# Altium footprint library Active.PcbLib: 325 footprints (part 21 of 23)
Each footprint in its own frame and in the unit in brackets; x right, y up, seen from the top. Pads: shape width x height; smd on the part's side, far side on the other; paste and mask are expansions set on the pad; w line width, h text height; cw(c..) or ccw(c..) is an arc to the next point about the centre after c.
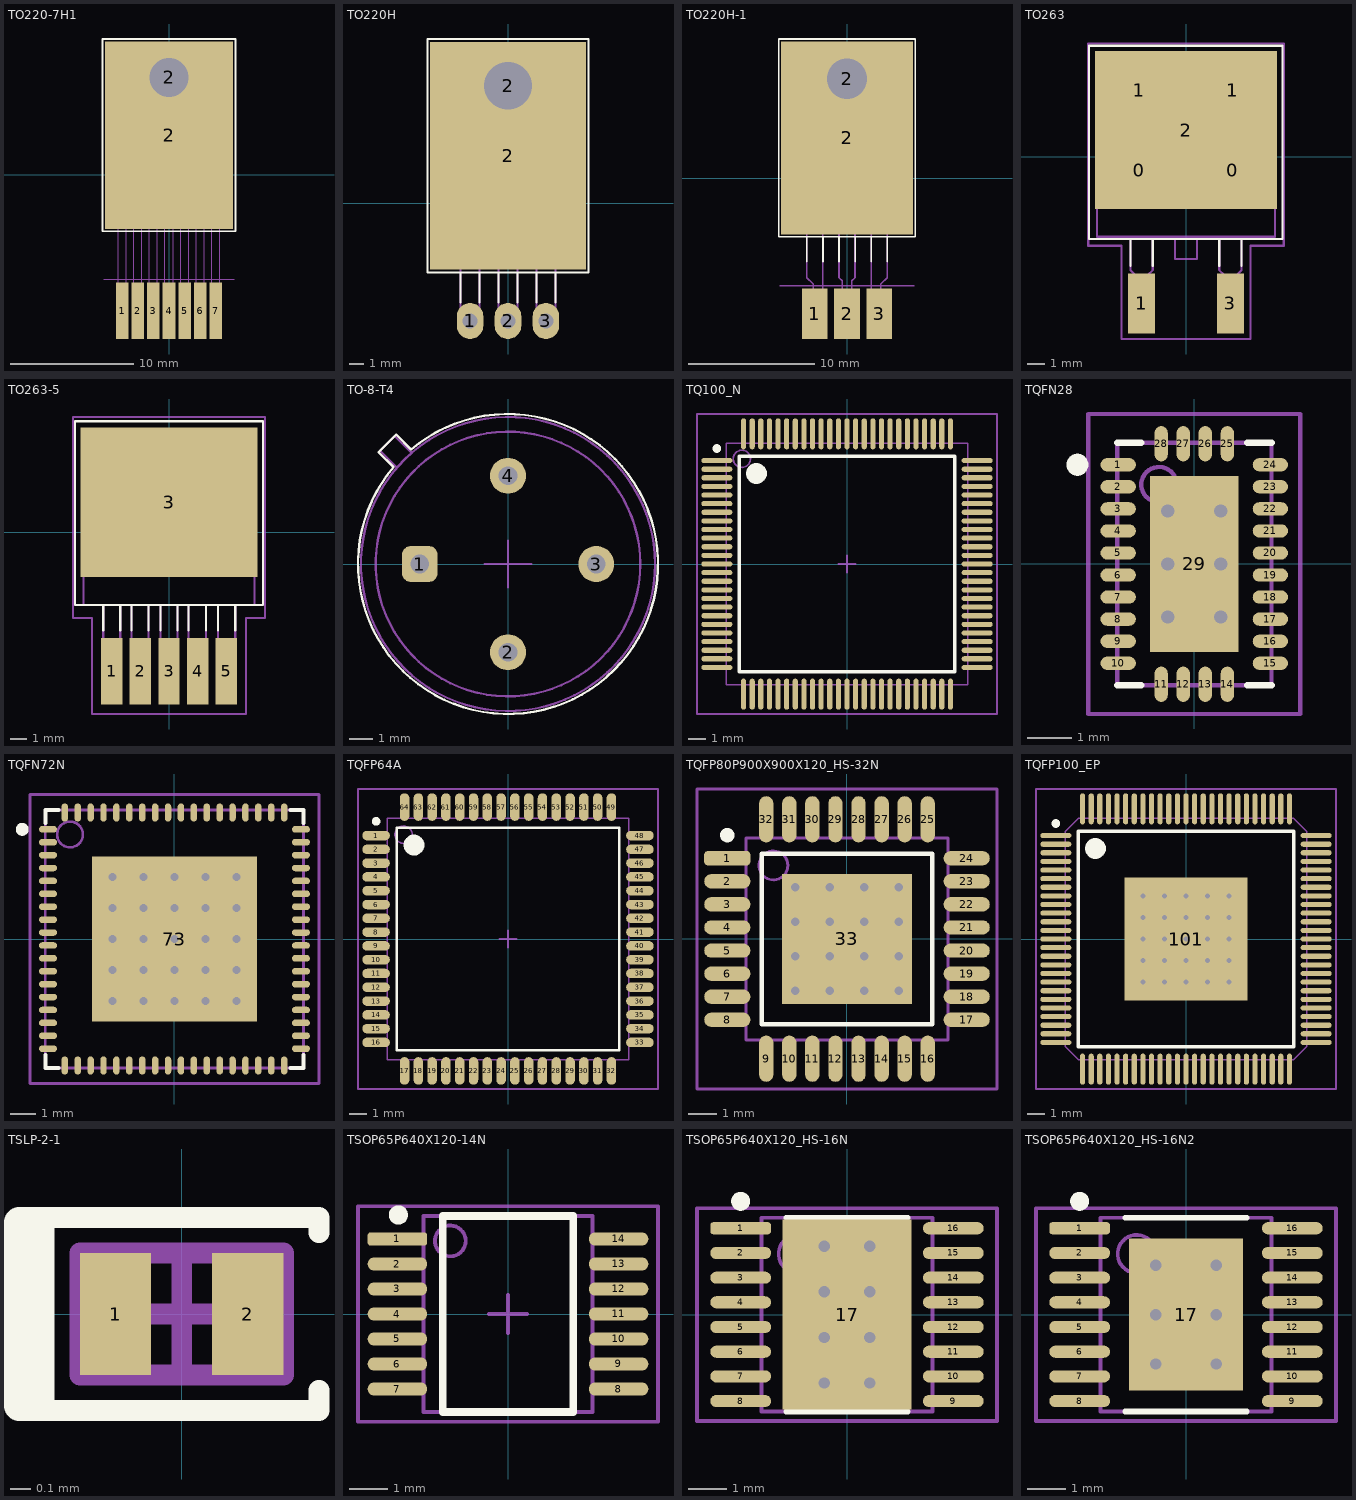
[diagram p20: the footprints below, top view; thin cyan lines are the x and y axes]

## TO220-7H1 [mil] "TO-220 horizontal 7pin"
height 196.85
pads (9):
  rect 40x180 smd mask+2.76: 1(-150,-435) 2(-100,-435) 3(-50,-435) 4(0,-435) 5(50,-435) 6(100,-435) 7(150,-435)
  rect 410x600 smd paste-500: 2(0,126.02)
  round 157.48 hole 125.98 mask+47.24: 2(0,311.02)
Top Overlay:
  lines w5: -212.6,-181.06 -212.6,434.09 212.6,434.09 212.6,-181.06 -212.6,-181.06
Mechanical 13:
  circle w3.94: c0,311.02 r75
  lines w3.94: -192.92,-169.29 -192.92,156.02 ; -163,-168.98 -163,-458 -158,-490 -142,-490 -137,-458 -137,-168.98 ; -113,-168.98 -113,-458 -108,-490 -92,-490 -87,-458 -87,-168.98 ; -63,-168.98 -63,-458 -58,-490 -42,-490 -37,-458 -37,-168.98 ; -13,-168.98 -13,-458 -8,-490 8,-490 13,-458 13,-168.98 ; 37,-168.98 37,-458 42,-490 58,-490 63,-458 63,-168.98 ; 87,-168.98 87,-458 92,-490 108,-490 113,-458 113,-168.98 ; 137,-168.98 137,-458 142,-490 158,-490 163,-458 163,-168.98 ; 192.91,-169.29 192.91,156.02 ; -200,171.02 200,171.02 ; -200,171.02 -200,-168.98 200,-168.98 200,171.02 ; -200,171.02 -200,421.02 200,421.02 200,171.02 ; -200,171.02 -192.92,156.02 ; -192.92,156.02 192.91,156.02 ; 192.91,156.02 200,171.02
Mechanical 15:
  lines w3.94: -208.66,-334.65 208.66,-334.65
3D body: height 114.17, standoff 102.36, extent 137,-490 163,-168.98
3D body: height 114.17, standoff 102.36, extent -163,-490 -137,-168.98
3D body: height 114.17, standoff 102.36, extent -113,-490 -87,-168.98
3D body: height 114.17, standoff 102.36, extent -63,-490 -37,-168.98
3D body: height 114.17, standoff 102.36, extent 87,-490 113,-168.98
3D body: height 114.17, standoff 102.36, extent 37,-490 63,-168.98
3D body: height 114.17, standoff 102.36, extent -13,-490 13,-168.98
3D body: height 39.37, standoff 0, extent -200,171.02 200,421.02
3D body: height 196.85, standoff 0, extent -200,-168.98 200,171.02

## TO220H [mil] "TO-220 horizontal"
height 196.85
pads (5):
  oval 70x95 hole 39.37: 1(-100,-310) 2(0,-310) 3(100,-310)
  rect 410x600 smd paste-500: 2(0,125)
  round 157.48 hole 125.98 mask+47.24: 2(0,310)
Top Overlay:
  lines w5: -125,-260.83 -125,-182.09 ; -74.8,-260.83 -74.8,-182.09 ; -25,-260.83 -25,-182.09 ; 25.2,-260.83 25.2,-182.09 ; 75,-260.83 75,-182.09 ; 125.2,-260.83 125.2,-182.09 ; -212.6,-182.09 -212.6,433.07 212.6,433.07 212.6,-182.09 -212.6,-182.09
Mechanical 13:
  circle w5: c0,310 r75
  lines w5: -200,155 200,155 ; -125,-170 -125,-310 -75,-310 -75,-170 ; -25,-170 -25,-310 25,-310 25,-170 ; 75,-170 75,-310 125,-310 125,-170 ; -200,170 200,170 ; -200,170 -200,-170 200,-170 200,170 ; -200,170 -200,420 200,420 200,170
3D body: height 102.36, standoff 90.55, extent 75,-320 125,-170
3D body: height 90.55, standoff 0, extent 75,-320 125,-305
3D body: height 102.36, standoff 90.55, extent -25,-320 25,-170
3D body: height 90.55, standoff 0, extent -25,-320 25,-305
3D body: height 90.55, standoff 0, extent -125,-320 -75,-305
3D body: height 102.36, standoff 90.55, extent -125,-320 -75,-170
3D body: height 39.37, standoff 0, extent -200,170 200,420
3D body: height 196.85, standoff 0, extent -200,-170 200,170
3D body: height 0, standoff -125.98, extent -116.14,-317.91 -83.66,-302.17
3D body: height 0, standoff -125.98, extent -16.14,-317.91 16.34,-302.17
3D body: height 0, standoff -125.98, extent 83.86,-317.91 116.34,-302.17

## TO220H-1 [mm] "TO-220 horizontal"
height 5
pads (5):
  rect 2.032x4 smd: 1(-2.54,-10.7) 2(0,-10.7) 3(2.54,-10.7)
  rect 10.414x15.24 smd paste-12.7: 2(0,3.201)
  round 4 hole 3.2 mask+1.2: 2(0,7.9)
Top Overlay:
  lines w0.127: -3.175,-6.599 -3.175,-4.599 ; -1.9,-6.599 -1.9,-4.599 ; -0.635,-6.599 -0.635,-4.599 ; 0.64,-6.599 0.64,-4.599 ; 1.905,-6.599 1.905,-4.599 ; 3.18,-6.599 3.18,-4.599 ; -5.4,-4.599 -5.4,11.026 5.4,11.026 5.4,-4.599 -5.4,-4.599
Mechanical 13:
  circle w0.127: c0,7.9 r1.905
  lines w0.127: -5.08,3.963 5.08,3.963 ; -3.175,-4.292 -3.175,-7.848 -2.667,-8.356 -2.667,-12.345 -1.905,-12.345 -1.905,-7.848 -1.905,-4.292 ; -0.635,-4.292 -0.635,-7.848 -0.381,-8.102 -0.381,-8.356 -0.381,-12.345 0.381,-12.345 0.381,-8.102 0.635,-7.848 0.635,-4.292 ; 1.905,-4.292 1.905,-7.848 1.905,-12.345 2.667,-12.345 2.667,-8.356 3.175,-7.848 3.175,-4.292 ; -5.08,4.344 5.08,4.344 ; -5.08,4.344 -5.08,-4.292 5.08,-4.292 5.08,4.344 ; -5.08,4.344 -5.08,10.694 5.08,10.694 5.08,4.344
Mechanical 15:
  lines w0.1: -5.3,-8.5 5.3,-8.5
3D body: height 2.6, standoff 2.3, extent 1.905,-12.345 3.175,-4.292
3D body: height 2.6, standoff 2.3, extent -0.635,-12.345 0.635,-4.292
3D body: height 2.6, standoff 2.3, extent -3.175,-12.345 -1.905,-4.292
3D body: height 1, standoff 0, extent -5.08,4.344 5.08,10.694
3D body: height 5, standoff 0, extent -5.08,-4.292 5.08,4.344

## TO263 [mil] "TO263 3pin D2PAK"
height 137.8
pads (7):
  rrect8% 190x160 on Top Paste mask+275.59: 0(-105,-30) 0(105,-30) 1(-105,150) 1(105,150)
  rect 60x135 smd: 1(-100,-330) 3(100,-330)
  rect 410x355 smd paste-196.85: 2(0,60)
Top Overlay:
  lines w5: -125,-245 -125,-185 ; -75,-245 -75,-185 ; 75,-245 75,-185 ; 125,-245 125,-185 ; -218,-185 -218,250 217,250 217,-185 -218,-185
Mechanical 13:
  lines w5: -125,-180 -125,-255 -115,-265 -115,-370 -85,-370 -85,-265 -75,-255 -75,-180 ; -25,-180 -25,-230 25,-230 25,-180 ; 75,-180 75,-255 85,-265 85,-370 115,-370 115,-265 125,-255 125,-180 ; -200,-180 -200,215 -120,230 120,230 200,215 200,-180 -200,-180
  lines w6: -200,180 200,180
Mechanical 15:
  lines w5: -220,-200 -145,-200 -145,-410 145,-410 145,-200 220,-200 220,255 -220,255 -220,-200
3D body: height 105, standoff 80, extent -25,-230 25,-180
3D body: height 105, standoff 80, extent 75,-265 125,-180
3D body: height 105, standoff 0, extent 85,-280 115,-265
3D body: height 20, standoff 0, extent 85,-370 115,-280
3D body: height 20, standoff 0, extent -115,-370 -85,-280
3D body: height 105, standoff 0, extent -115,-280 -85,-265
3D body: height 105, standoff 80, extent -125,-265 -75,-180
3D body: height 175, standoff 0, extent -200,-180 200,180
3D body: height 50, standoff 0, extent -200,180 200,230

## TO263-5 [mil]
height 137.8
pads (6):
  rect 50x155 smd: 1(-134,-325) 2(-67,-325) 3(0,-325) 4(67,-325) 5(134,-325)
  rect 414.02x350 smd paste-393.7: 3(0,70)
Top Overlay:
  lines w5: -154,-230 -154,-170 ; -114,-230 -114,-170 ; -88,-230 -88,-170 ; -48,-230 -48,-170 ; -20,-230 -20,-170 ; 20,-230 20,-170 ; 46,-230 46,-170 ; 87,-230 87,-170 ; 115,-230 115,-170 ; 155,-230 155,-170 ; -220,-170 220,-170 220,260 -220,260 -220,-170
Top Paste:
  circle w35.43: c165.35,-59.06 r17.72
  circle w35.43: c82.68,-59.06 r17.72
  circle w35.43: c-165.35,-59.06 r17.72
  circle w35.43: c-82.68,-59.06 r17.72
  circle w35.43: c0,-59.06 r17.72
  circle w35.43: c0,27.56 r17.72
  circle w35.43: c-82.68,27.56 r17.72
  circle w35.43: c-165.35,27.56 r17.72
  circle w35.43: c82.68,27.56 r17.72
  circle w35.43: c165.35,27.56 r17.72
  circle w35.43: c0,114.17 r17.72
  circle w35.43: c-82.68,114.17 r17.72
  circle w35.43: c-165.35,114.17 r17.72
  circle w35.43: c82.68,114.17 r17.72
  circle w35.43: c165.35,114.17 r17.72
  circle w35.43: c0,200.79 r17.72
  circle w35.43: c-82.68,200.79 r17.72
  circle w35.43: c-165.35,200.79 r17.72
  circle w35.43: c82.68,200.79 r17.72
  circle w35.43: c165.35,200.79 r17.72
Mechanical 13:
  lines w5: -154,-170 -154,-340 -114,-340 -114,-170 ; -88,-170 -88,-340 -48,-340 -48,-170 200,-170 ; -20,-170 -20,-340 20,-340 20,-170 ; 46,-170 46,-340 86,-340 ; 87,-340 87,-170 ; 115,-170 115,-340 155,-340 155,-170 ; -200,170 200,170 ; -200,170 -200,-170 200,-170 ; -200,170 -200,220 200,220 200,170 ; 200,-170 200,170
Mechanical 15:
  lines w4: -40,0 40,0 ; 0,-40 0,40
  lines w5: -225,-200 -180,-200 -180,-425 180,-425 180,-200 225,-200 225,270 -225,270 -225,-200
3D body: height 137.8, standoff 0, extent -200,-170 200,170
3D body: height 39.37, standoff 0, extent -200,170 200,220
3D body: height 19.68, standoff 0, extent -154,-340 -114,-170
3D body: height 19.68, standoff 0, extent -87.83,-340 -47.83,-170
3D body: height 19.68, standoff 0, extent -19.83,-340 20.17,-170
3D body: height 19.68, standoff 0, extent 47.17,-340 87.17,-170
3D body: height 19.68, standoff 0, extent 115.17,-340 155.17,-170

## TO-8-T4 [mm] "TO-8 4pin metal"
height 7
pads (4):
  rrect50% 1.55x1.55 hole 0.8: 1(-3.81,0)
  round 1.55 hole 0.8: 2(0,-3.81) 3(3.81,0) 4(0,3.81)
Top Overlay:
  lines w0.1: -4.944,4.184 ccw(c0,0) -4.184,4.944
  lines w0.102: -4.944,4.184 -5.587,4.826 -5.588,4.826 -4.826,5.588 -4.184,4.946 -4.184,4.944
Mechanical 13:
  circle w0.1: c0,0 r6.35
  circle w0.1: c0,0 r5.715
  lines w0.102: -4.826,4.191 -5.524,4.889 -4.889,5.524 -4.191,4.826
Mechanical 15:
  lines w0.102: -1.016,0 1.016,0 ; 0,-1.016 0,1.016
3D body: height 7, standoff 0, extent -5.715,-5.715 5.715,5.715
3D body: height 1, standoff 0, extent -6.35,-6.35 6.35,6.35
3D body: height 1, standoff 0, extent -5.524,4.191 -4.191,5.524

## TQ100_N [mm] "Thin QFP 100, 14x14mm, R0.5mm, IPC Medium Density"
height 1.6
pads (100):
  oval 1.8x0.3 smd mask+0.051: 1(-7.55,6) 2(-7.55,5.5) 3(-7.55,5) 4(-7.55,4.5) 5(-7.55,4) 6(-7.55,3.5) 7(-7.55,3) 8(-7.55,2.5) 9(-7.55,2) 10(-7.55,1.5) 11(-7.55,1) 12(-7.55,0.5) 13(-7.55,0) 14(-7.55,-0.5) 15(-7.55,-1) 16(-7.55,-1.5) 17(-7.55,-2) 18(-7.55,-2.5) 19(-7.55,-3) 20(-7.55,-3.5) 21(-7.55,-4) 22(-7.55,-4.5) 23(-7.55,-5) 24(-7.55,-5.5) 25(-7.55,-6) 51(7.55,-6) 52(7.55,-5.5) 53(7.55,-5) 54(7.55,-4.5) 55(7.55,-4) 56(7.55,-3.5) 57(7.55,-3) 58(7.55,-2.5) 59(7.55,-2) 60(7.55,-1.5) 61(7.55,-1) 62(7.55,-0.5) 63(7.55,0) 64(7.55,0.5) 65(7.55,1) 66(7.55,1.5) 67(7.55,2) 68(7.55,2.5) 69(7.55,3) 70(7.55,3.5) 71(7.55,4) 72(7.55,4.5) 73(7.55,5) 74(7.55,5.5) 75(7.55,6)
  oval 0.3x1.8 smd mask+0.051: 26(-6,-7.55) 27(-5.5,-7.55) 28(-5,-7.55) 29(-4.5,-7.55) 30(-4,-7.55) 31(-3.5,-7.55) 32(-3,-7.55) 33(-2.5,-7.55) 34(-2,-7.55) 35(-1.5,-7.55) 36(-1,-7.55) 37(-0.5,-7.55) 38(0,-7.55) 39(0.5,-7.55) 40(1,-7.55) 41(1.5,-7.55) 42(2,-7.55) 43(2.5,-7.55) 44(3,-7.55) 45(3.5,-7.55) 46(4,-7.55) 47(4.5,-7.55) 48(5,-7.55) 49(5.5,-7.55) 50(6,-7.55) 76(6,7.55) 77(5.5,7.55) 78(5,7.55) 79(4.5,7.55) 80(4,7.55) 81(3.5,7.55) 82(3,7.55) 83(2.5,7.55) 84(2,7.55) 85(1.5,7.55) 86(1,7.55) 87(0.5,7.55) 88(0,7.55) 89(-0.5,7.55) 90(-1,7.55) 91(-1.5,7.55) 92(-2,7.55) 93(-2.5,7.55) 94(-3,7.55) 95(-3.5,7.55) 96(-4,7.55) 97(-4.5,7.55) 98(-5,7.55) 99(-5.5,7.55) 100(-6,7.55)
Top Overlay:
  circle w0.6: c-5.25,5.25 r0.3
  circle w0.25: c-7.55,6.7 r0.125
  lines w0.2: -6.25,-6.25 6.25,-6.25 6.25,6.25 -6.25,6.25 -6.25,-6.25
Mechanical 13:
  circle w0.1: c-6.1,6.1 r0.5
  lines w0.1: -7,-7 7,-7 7,7 -7,7 -7,-7
Mechanical 15:
  lines w0.1: -0.5,0 0.5,0 ; 0,-0.5 0,0.5 ; -8.7,-8.7 8.7,-8.7 8.7,8.7 -8.7,8.7 -8.7,-8.7
3D body: height 1.6, standoff 0, extent -7,-7 7,7

## TQFN28 [mm] "TQFN 28pin 0.8mm R0.5mm"
height 0.8
pads (29):
  oval 0.8x0.3 smd mask+0.025: 1(-1.725,2.25) 2(-1.725,1.75) 3(-1.725,1.25) 4(-1.725,0.75) 5(-1.725,0.25) 6(-1.725,-0.25) 7(-1.725,-0.75) 8(-1.725,-1.25) 9(-1.725,-1.75) 10(-1.725,-2.25) 15(1.725,-2.25) 16(1.725,-1.75) 17(1.725,-1.25) 18(1.725,-0.75) 19(1.725,-0.25) 20(1.725,0.25) 21(1.725,0.75) 22(1.725,1.25) 23(1.725,1.75) 24(1.725,2.25)
  oval 0.3x0.8 smd mask+0.025: 11(-0.75,-2.725) 12(-0.25,-2.725) 13(0.25,-2.725) 14(0.75,-2.725) 25(0.75,2.725) 26(0.25,2.725) 27(-0.25,2.725) 28(-0.75,2.725)
  rect 2x4 smd paste-5 mask-3: 29(0,0)
via 0.6,-1.2 diameter 0.65 hole 0.3
via -0.6,-1.2 diameter 0.65 hole 0.3
via 0.6,0 diameter 0.65 hole 0.3
via -0.6,0 diameter 0.65 hole 0.3
via 0.6,1.2 diameter 0.65 hole 0.3
via -0.6,1.2 diameter 0.65 hole 0.3
Top Overlay:
  circle w0.25: c-2.65,2.25 r0.125
  lines w0.15: -1.75,-2.75 -1.2,-2.75 ; -1.75,2.75 -1.2,2.75 ; 1.2,-2.75 1.75,-2.75 ; 1.2,2.75 1.75,2.75
Top Paste:
  region: -0.9,-0.85 -0.475,-0.85 -0.25,-1.075 0.25,-1.075 0.475,-0.85 0.9,-0.85 0.9,-0.35 0.475,-0.35 0.275,-0.15 -0.275,-0.15 -0.475,-0.35 -0.9,-0.35
  region: -0.9,-1.9 -0.9,-1.55 -0.475,-1.55 -0.25,-1.325 0.25,-1.325 0.475,-1.55 0.9,-1.55 0.9,-1.9
  region: -0.9,1.9 -0.9,1.55 -0.475,1.55 -0.25,1.325 0.25,1.325 0.475,1.55 0.9,1.55 0.9,1.9
  region: -0.9,0.85 -0.475,0.85 -0.25,1.075 0.25,1.075 0.475,0.85 0.9,0.85 0.9,0.35 0.475,0.35 0.275,0.15 -0.275,0.15 -0.475,0.35 -0.9,0.35
Top Solder:
  drawing of 1 lines, arcs and shapes, not listed
Mechanical 12:
  circle w0.4: c-0.6,1.2 r0.15
  circle w0.4: c0.6,1.2 r0.15
  circle w0.4: c-0.6,0 r0.15
  circle w0.4: c0.6,0 r0.15
  circle w0.4: c-0.6,-1.2 r0.15
  circle w0.4: c0.6,-1.2 r0.15
Mechanical 13:
  circle w0.1: c-0.8,1.8 r0.4
  lines w0.1: -1.75,-2.75 1.75,-2.75 1.75,2.75 -1.75,2.75 -1.75,-2.75
Mechanical 15:
  lines w0.1: -0.5,0 0.5,0 ; 0,-0.5 0,0.5 ; -2.4,-3.4 2.4,-3.4 2.4,3.4 -2.4,3.4 -2.4,-3.4
3D body: height 0.8, standoff 0.01, extent -1.75,-2.75 1.75,2.75
3D body: height 0.81, standoff 0.8, extent -1.2,1.4 -0.4,2.2

## TQFN72N [mm]
height 0.8
pads (73):
  oval 0.7x0.25 smd mask+0.025: 1(-4.9,4.25) 2(-4.9,3.75) 3(-4.9,3.25) 4(-4.9,2.75) 5(-4.9,2.25) 6(-4.9,1.75) 7(-4.9,1.25) 8(-4.9,0.75) 9(-4.9,0.25) 10(-4.9,-0.25) 11(-4.9,-0.75) 12(-4.9,-1.25) 13(-4.9,-1.75) 14(-4.9,-2.25) 15(-4.9,-2.75) 16(-4.9,-3.25) 17(-4.9,-3.75) 18(-4.9,-4.25) 37(4.9,-4.25) 38(4.9,-3.75) 39(4.9,-3.25) 40(4.9,-2.75) 41(4.9,-2.25) 42(4.9,-1.75) 43(4.9,-1.25) 44(4.9,-0.75) 45(4.9,-0.25) 46(4.9,0.25) 47(4.9,0.75) 48(4.9,1.25) 49(4.9,1.75) 50(4.9,2.25) 51(4.9,2.75) 52(4.9,3.25) 53(4.9,3.75) 54(4.9,4.25)
  oval 0.25x0.7 smd mask+0.025: 19(-4.25,-4.9) 20(-3.75,-4.9) 21(-3.25,-4.9) 22(-2.75,-4.9) 23(-2.25,-4.9) 24(-1.75,-4.9) 25(-1.25,-4.9) 26(-0.75,-4.9) 27(-0.25,-4.9) 28(0.25,-4.9) 29(0.75,-4.9) 30(1.25,-4.9) 31(1.75,-4.9) 32(2.25,-4.9) 33(2.75,-4.9) 34(3.25,-4.9) 35(3.75,-4.9) 36(4.25,-4.9) 55(4.25,4.9) 56(3.75,4.9) 57(3.25,4.9) 58(2.75,4.9) 59(2.25,4.9) 60(1.75,4.9) 61(1.25,4.9) 62(0.75,4.9) 63(0.25,4.9) 64(-0.25,4.9) 65(-0.75,4.9) 66(-1.25,4.9) 67(-1.75,4.9) 68(-2.25,4.9) 69(-2.75,4.9) 70(-3.25,4.9) 71(-3.75,4.9) 72(-4.25,4.9)
  rect 6.4x6.4 smd paste-7.62 mask-8: 73(0,0)
via 2.4,-2.4 diameter 0.65 hole 0.3
via 1.2,-2.4 diameter 0.65 hole 0.3
via 0,-2.4 diameter 0.65 hole 0.3
via -1.2,-2.4 diameter 0.65 hole 0.3
via -2.4,-2.4 diameter 0.65 hole 0.3
via 2.4,-1.2 diameter 0.65 hole 0.3
via 1.2,-1.2 diameter 0.65 hole 0.3
via 0,-1.2 diameter 0.65 hole 0.3
via -1.2,-1.2 diameter 0.65 hole 0.3
via -2.4,-1.2 diameter 0.65 hole 0.3
via 2.4,0 diameter 0.65 hole 0.3
via 1.2,0 diameter 0.65 hole 0.3
via 0,0 diameter 0.65 hole 0.3
via -1.2,0 diameter 0.65 hole 0.3
via -2.4,0 diameter 0.65 hole 0.3
via 2.4,1.2 diameter 0.65 hole 0.3
via 1.2,1.2 diameter 0.65 hole 0.3
via 0,1.2 diameter 0.65 hole 0.3
via -1.2,1.2 diameter 0.65 hole 0.3
via -2.4,1.2 diameter 0.65 hole 0.3
via 2.4,2.4 diameter 0.65 hole 0.3
via 1.2,2.4 diameter 0.65 hole 0.3
via 0,2.4 diameter 0.65 hole 0.3
via -1.2,2.4 diameter 0.65 hole 0.3
via -2.4,2.4 diameter 0.65 hole 0.3
Top Overlay:
  circle w0.25: c-5.9,4.25 r0.125
  lines w0.15: -5,-4.5 -5,-5 -4.5,-5 ; -5,4.5 -5,5 -4.5,5 ; 4.5,-5 5,-5 5,-4.5 ; 4.5,5 5,5 5,4.5
Top Paste:
  drawing of 36 lines, arcs and shapes, not listed
Top Solder:
  drawing of 2 lines, arcs and shapes, not listed
Mechanical 12:
  circle w0.4: c-2.4,2.4 r0.15
  circle w0.4: c-1.2,2.4 r0.15
  circle w0.4: c0,2.4 r0.15
  circle w0.4: c1.2,2.4 r0.15
  circle w0.4: c2.4,2.4 r0.15
  circle w0.4: c-2.4,1.2 r0.15
  circle w0.4: c-1.2,1.2 r0.15
  circle w0.4: c0,1.2 r0.15
  circle w0.4: c1.2,1.2 r0.15
  circle w0.4: c2.4,1.2 r0.15
  circle w0.4: c-2.4,0 r0.15
  circle w0.4: c-1.2,0 r0.15
  circle w0.4: c0,0 r0.15
  circle w0.4: c1.2,0 r0.15
  circle w0.4: c2.4,0 r0.15
  circle w0.4: c-2.4,-1.2 r0.15
  circle w0.4: c-1.2,-1.2 r0.15
  circle w0.4: c0,-1.2 r0.15
  circle w0.4: c1.2,-1.2 r0.15
  circle w0.4: c2.4,-1.2 r0.15
  circle w0.4: c-2.4,-2.4 r0.15
  circle w0.4: c-1.2,-2.4 r0.15
  circle w0.4: c0,-2.4 r0.15
  circle w0.4: c1.2,-2.4 r0.15
  circle w0.4: c2.4,-2.4 r0.15
Mechanical 13:
  circle w0.1: c-4.05,4.05 r0.5
  lines w0.1: -5,-5 5,-5 5,5 -5,5 -5,-5
Mechanical 15:
  lines w0.1: -0.5,0 0.5,0 ; 0,-0.5 0,0.5 ; -5.6,-5.6 5.6,-5.6 5.6,5.6 -5.6,5.6 -5.6,-5.6
3D body: height 0.81, standoff 0.8, extent -4.55,3.55 -3.55,4.55
3D body: height 0.8, standoff 0.01, extent -5,-5 5,5

## TQFP64A [mm] "TQFP, 64-Leads, Body 16,0x16,0mm (max), Pitch 0,80mm, IPC Medium Density"
height 1
pads (64):
  oval 1.6x0.55 smd mask+0.051: 1(-7.65,6) 2(-7.65,5.2) 3(-7.65,4.4) 4(-7.65,3.6) 5(-7.65,2.8) 6(-7.65,2) 7(-7.65,1.2) 8(-7.65,0.4) 9(-7.65,-0.4) 10(-7.65,-1.2) 11(-7.65,-2) 12(-7.65,-2.8) 13(-7.65,-3.6) 14(-7.65,-4.4) 15(-7.65,-5.2) 16(-7.65,-6) 33(7.65,-6) 34(7.65,-5.2) 35(7.65,-4.4) 36(7.65,-3.6) 37(7.65,-2.8) 38(7.65,-2) 39(7.65,-1.2) 40(7.65,-0.4) 41(7.65,0.4) 42(7.65,1.2) 43(7.65,2) 44(7.65,2.8) 45(7.65,3.6) 46(7.65,4.4) 47(7.65,5.2) 48(7.65,6)
  oval 0.55x1.6 smd mask+0.051: 17(-6,-7.65) 18(-5.2,-7.65) 19(-4.4,-7.65) 20(-3.6,-7.65) 21(-2.8,-7.65) 22(-2,-7.65) 23(-1.2,-7.65) 24(-0.4,-7.65) 25(0.4,-7.65) 26(1.2,-7.65) 27(2,-7.65) 28(2.8,-7.65) 29(3.6,-7.65) 30(4.4,-7.65) 31(5.2,-7.65) 32(6,-7.65) 49(6,7.65) 50(5.2,7.65) 51(4.4,7.65) 52(3.6,7.65) 53(2.8,7.65) 54(2,7.65) 55(1.2,7.65) 56(0.4,7.65) 57(-0.4,7.65) 58(-1.2,7.65) 59(-2,7.65) 60(-2.8,7.65) 61(-3.6,7.65) 62(-4.4,7.65) 63(-5.2,7.65) 64(-6,7.65)
Top Overlay:
  circle w0.25: c-7.65,6.825 r0.125
  circle w0.6: c-5.45,5.45 r0.3
  lines w0.127: -6.45,-6.45 -6.45,6.45 6.45,6.45 6.45,-6.45 -6.45,-6.45
Mechanical 13:
  circle w0.1: c-6.05,6.05 r0.5
  lines w0.1: -7,-7 -7,7 7,7 7,-7 -7,-7
Mechanical 15:
  lines w0.1: -0.5,0 0.5,0 ; 0,-0.5 0,0.5 ; -8.7,-8.7 -8.7,8.7 8.7,8.7 8.7,-8.7 -8.7,-8.7
3D body: height 1, standoff 0.1, extent -7,-7 7,7
3D body: height 1.05, standoff 0.9, extent -6.55,5.55 -5.55,6.55

## TQFP80P900X900X120_HS-32N [mm] "TQFP, 32-Leads, Body 9,0x9,0mm (max), Pitch 0,80mm, IPC Medium Density"
height 1.2
pads (33):
  rrect50% 1.6x0.5 smd mask+0.051: 1(-4.15,2.8)
  oval 1.6x0.5 smd mask+0.051: 2(-4.15,2) 3(-4.15,1.2) 4(-4.15,0.4) 5(-4.15,-0.4) 6(-4.15,-1.2) 7(-4.15,-2) 8(-4.15,-2.8) 17(4.15,-2.8) 18(4.15,-2) 19(4.15,-1.2) 20(4.15,-0.4) 21(4.15,0.4) 22(4.15,1.2) 23(4.15,2) 24(4.15,2.8)
  oval 0.5x1.6 smd mask+0.051: 9(-2.8,-4.15) 10(-2,-4.15) 11(-1.2,-4.15) 12(-0.4,-4.15) 13(0.4,-4.15) 14(1.2,-4.15) 15(2,-4.15) 16(2.8,-4.15) 25(2.8,4.15) 26(2,4.15) 27(1.2,4.15) 28(0.4,4.15) 29(-0.4,4.15) 30(-1.2,4.15) 31(-2,4.15) 32(-2.8,4.15)
  rect 4.5x4.5 smd paste-4 mask-5: 33(0,0)
via 1.8,-1.8 diameter 0.65 hole 0.3
via 0.6,-1.8 diameter 0.65 hole 0.3
via -0.6,-1.8 diameter 0.65 hole 0.3
via -1.8,-1.8 diameter 0.65 hole 0.3
via 1.8,-0.6 diameter 0.65 hole 0.3
via 0.6,-0.6 diameter 0.65 hole 0.3
via -0.6,-0.6 diameter 0.65 hole 0.3
via -1.8,-0.6 diameter 0.65 hole 0.3
via 1.8,0.6 diameter 0.65 hole 0.3
via 0.6,0.6 diameter 0.65 hole 0.3
via -0.6,0.6 diameter 0.65 hole 0.3
via -1.8,0.6 diameter 0.65 hole 0.3
via 1.8,1.8 diameter 0.65 hole 0.3
via 0.6,1.8 diameter 0.65 hole 0.3
via -0.6,1.8 diameter 0.65 hole 0.3
via -1.8,1.8 diameter 0.65 hole 0.3
Top Overlay:
  circle w0.25: c-4.15,3.6 r0.125
  lines w0.15: -2.95,-2.95 2.95,-2.95 2.95,2.95 -2.95,2.95 -2.95,-2.95
Top Paste:
  drawing of 9 lines, arcs and shapes, not listed
Top Solder:
  drawing of 1 lines, arcs and shapes, not listed
Mechanical 12:
  circle w0.4: c1.8,-1.8 r0.15
  circle w0.4: c0.6,-1.8 r0.15
  circle w0.4: c-0.6,-1.8 r0.15
  circle w0.4: c-1.8,-1.8 r0.15
  circle w0.4: c1.8,-0.6 r0.15
  circle w0.4: c0.6,-0.6 r0.15
  circle w0.4: c-0.6,-0.6 r0.15
  circle w0.4: c-1.8,-0.6 r0.15
  circle w0.4: c1.8,0.6 r0.15
  circle w0.4: c0.6,0.6 r0.15
  circle w0.4: c-0.6,0.6 r0.15
  circle w0.4: c-1.8,0.6 r0.15
  circle w0.4: c1.8,1.8 r0.15
  circle w0.4: c0.6,1.8 r0.15
  circle w0.4: c-0.6,1.8 r0.15
  circle w0.4: c-1.8,1.8 r0.15
Mechanical 13:
  circle w0.1: c-2.55,2.55 r0.5
  lines w0.1: -3.5,-3.5 3.5,-3.5 3.5,3.5 -3.5,3.5 -3.5,-3.5
Mechanical 15:
  lines w0.1: -0.5,0 0.5,0 ; 0,-0.5 0,0.5 ; -5.2,-5.2 5.2,-5.2 5.2,5.2 -5.2,5.2 -5.2,-5.2
3D body: height 1.21, standoff 1.2, extent -3.048,2.057 -2.05,3.048
3D body: height 1.2, standoff 0.1, extent -3.5,-3.5 3.5,3.5

## TQFP100_EP [mm] "Thin QFP 100, 14x14mm, R0.5mm, IPC Medium Density"
height 1.2
pads (101):
  oval 1.8x0.3 smd mask+0.038: 1(-7.55,6) 2(-7.55,5.5) 3(-7.55,5) 4(-7.55,4.5) 5(-7.55,4) 6(-7.55,3.5) 7(-7.55,3) 8(-7.55,2.5) 9(-7.55,2) 10(-7.55,1.5) 11(-7.55,1) 12(-7.55,0.5) 13(-7.55,0) 14(-7.55,-0.5) 15(-7.55,-1) 16(-7.55,-1.5) 17(-7.55,-2) 18(-7.55,-2.5) 19(-7.55,-3) 20(-7.55,-3.5) 21(-7.55,-4) 22(-7.55,-4.5) 23(-7.55,-5) 24(-7.55,-5.5) 25(-7.55,-6) 51(7.55,-6) 52(7.55,-5.5) 53(7.55,-5) 54(7.55,-4.5) 55(7.55,-4) 56(7.55,-3.5) 57(7.55,-3) 58(7.55,-2.5) 59(7.55,-2) 60(7.55,-1.5) 61(7.55,-1) 62(7.55,-0.5) 63(7.55,0) 64(7.55,0.5) 65(7.55,1) 66(7.55,1.5) 67(7.55,2) 68(7.55,2.5) 69(7.55,3) 70(7.55,3.5) 71(7.55,4) 72(7.55,4.5) 73(7.55,5) 74(7.55,5.5) 75(7.55,6)
  oval 0.3x1.8 smd mask+0.038: 26(-6,-7.55) 27(-5.5,-7.55) 28(-5,-7.55) 29(-4.5,-7.55) 30(-4,-7.55) 31(-3.5,-7.55) 32(-3,-7.55) 33(-2.5,-7.55) 34(-2,-7.55) 35(-1.5,-7.55) 36(-1,-7.55) 37(-0.5,-7.55) 38(0,-7.55) 39(0.5,-7.55) 40(1,-7.55) 41(1.5,-7.55) 42(2,-7.55) 43(2.5,-7.55) 44(3,-7.55) 45(3.5,-7.55) 46(4,-7.55) 47(4.5,-7.55) 48(5,-7.55) 49(5.5,-7.55) 50(6,-7.55) 76(6,7.55) 77(5.5,7.55) 78(5,7.55) 79(4.5,7.55) 80(4,7.55) 81(3.5,7.55) 82(3,7.55) 83(2.5,7.55) 84(2,7.55) 85(1.5,7.55) 86(1,7.55) 87(0.5,7.55) 88(0,7.55) 89(-0.5,7.55) 90(-1,7.55) 91(-1.5,7.55) 92(-2,7.55) 93(-2.5,7.55) 94(-3,7.55) 95(-3.5,7.55) 96(-4,7.55) 97(-4.5,7.55) 98(-5,7.55) 99(-5.5,7.55) 100(-6,7.55)
  rect 7.15x7.15 smd paste-5 mask-5: 101(0,0)
via -2.5,-2.5 diameter 0.65 hole 0.3
via -2.5,-1.25 diameter 0.65 hole 0.3
via -1.25,-2.5 diameter 0.65 hole 0.3
via -1.25,-1.25 diameter 0.65 hole 0.3
via 1.25,-2.5 diameter 0.65 hole 0.3
via 1.25,-1.25 diameter 0.65 hole 0.3
via 2.5,-2.5 diameter 0.65 hole 0.3
via 2.5,-1.25 diameter 0.65 hole 0.3
via 2.5,2.5 diameter 0.65 hole 0.3
via 2.5,1.25 diameter 0.65 hole 0.3
via 1.25,2.5 diameter 0.65 hole 0.3
via 1.25,1.25 diameter 0.65 hole 0.3
via -1.25,2.5 diameter 0.65 hole 0.3
via -1.25,1.25 diameter 0.65 hole 0.3
via -2.5,2.5 diameter 0.65 hole 0.3
via -2.5,1.25 diameter 0.65 hole 0.3
via 0,0 diameter 0.65 hole 0.3
via -1.25,0 diameter 0.65 hole 0.3
via -2.5,0 diameter 0.65 hole 0.3
via 1.25,0 diameter 0.65 hole 0.3
via 2.5,0 diameter 0.65 hole 0.3
via 0,-2.5 diameter 0.65 hole 0.3
via 0,-1.25 diameter 0.65 hole 0.3
via 0,2.5 diameter 0.65 hole 0.3
via 0,1.25 diameter 0.65 hole 0.3
Top Overlay:
  circle w0.6: c-5.25,5.25 r0.3
  circle w0.25: c-7.55,6.7 r0.125
  lines w0.2: -6.25,-6.25 6.25,-6.25 6.25,6.25 -6.25,6.25 -6.25,-6.25
Top Paste:
  drawing of 36 lines, arcs and shapes, not listed
Top Solder:
  drawing of 1 lines, arcs and shapes, not listed
Mechanical 12:
  circle w0.4: c-2.5,-2.5 r0.15
  circle w0.4: c-2.5,-1.25 r0.15
  circle w0.4: c-1.25,-2.5 r0.15
  circle w0.4: c-1.25,-1.25 r0.15
  circle w0.4: c1.25,-2.5 r0.15
  circle w0.4: c1.25,-1.25 r0.15
  circle w0.4: c2.5,-2.5 r0.15
  circle w0.4: c2.5,-1.25 r0.15
  circle w0.4: c2.5,2.5 r0.15
  circle w0.4: c2.5,1.25 r0.15
  circle w0.4: c1.25,2.5 r0.15
  circle w0.4: c1.25,1.25 r0.15
  circle w0.4: c-1.25,2.5 r0.15
  circle w0.4: c-1.25,1.25 r0.15
  circle w0.4: c-2.5,2.5 r0.15
  circle w0.4: c-2.5,1.25 r0.15
  circle w0.4: c-1.25,0 r0.15
  circle w0.4: c-2.5,0 r0.15
  circle w0.4: c1.25,0 r0.15
  circle w0.4: c2.5,0 r0.15
  circle w0.4: c0,-2.5 r0.15
  circle w0.4: c0,-1.25 r0.15
  circle w0.4: c0,2.5 r0.15
  circle w0.4: c0,1.25 r0.15
  circle w0.4: c0,0 r0.15
Mechanical 13:
  circle w0.1: c-5.25,5.258 r0.5
  lines w0.1: -7,-6.233 -7,6.233 -6.233,7 6.233,7 7,6.233 7,-6.233 6.233,-7 -6.233,-7 -7,-6.233
Mechanical 15:
  lines w0.1: -0.5,0 0.5,0 ; 0,-0.5 0,0.5 ; -8.7,-8.7 8.7,-8.7 8.7,8.7 -8.7,8.7 -8.7,-8.7
3D body: height 1.05, standoff 0, extent -7,-7 7.01,7.01
3D body: height 1.05, standoff 0, extent -5.74,4.75 -4.728,5.764

## TSLP-2-1 [mm] "TSLP-2-1 diode"
height 0.4
pads (2):
  rect 0.35x0.6 smd: 1(-0.325,0) 2(0.325,0)
Top Overlay:
  lines w0.102: -0.8,-0.475 -0.7,-0.475 0.675,-0.475 0.675,-0.375 ; -0.8,0.475 -0.7,0.475 0.675,0.475 0.675,0.4
  lines w0.15: -0.8,-0.45 -0.8,0.45 ; -0.7,-0.45 -0.7,0.45
Mechanical 13:
  lines w0.102: -0.5,-0.3 -0.5,0.3 ; -0.5,-0.3 -0.5,0.3 ; -0.5,-0.3 0.5,-0.3 0.5,0.3 -0.5,0.3
Mechanical 15:
  lines w0.102: -0.3,0 0.3,0 ; 0,-0.3 0,0.3
3D body: height 0.41, standoff 0.4, extent -0.525,-0.3 -0.325,0.3
3D body: height 0.4, standoff 0, extent -0.525,-0.3 0.5,0.3

## TSOP65P640X120-14N [mm] "TSSOP14, 14-Leads, Body 5,1x4,4mm (max), Pitch 0,65mm, IPC Medium Density"
height 1.2
pads (14):
  rrect50% 1.55x0.35 smd: 1(-2.875,1.95)
  oval 1.55x0.35 smd: 2(-2.875,1.3) 3(-2.875,0.65) 4(-2.875,0) 5(-2.875,-0.65) 6(-2.875,-1.3) 7(-2.875,-1.95) 8(2.875,-1.95) 9(2.875,-1.3) 10(2.875,-0.65) 11(2.875,0) 12(2.875,0.65) 13(2.875,1.3) 14(2.875,1.95)
Top Overlay:
  circle w0.25: c-2.85,2.575 r0.125
  lines w0.2: -1.7,-2.55 1.7,-2.55 1.7,2.55 -1.7,2.55 -1.7,-2.55
Mechanical 13:
  circle w0.1: c-1.5,1.9 r0.4
  lines w0.1: -2.2,-2.55 2.2,-2.55 2.2,2.55 -2.2,2.55 -2.2,-2.55
Mechanical 15:
  lines w0.1: -0.5,0 0.5,0 ; 0,-0.5 0,0.5 ; -3.9,-2.8 3.9,-2.8 3.9,2.8 -3.9,2.8 -3.9,-2.8
3D body: height 0.15, standoff 0, extent 2.4,-2.1 3.15,-1.8
3D body: height 0.6, standoff 0.15, extent 2.4,-2.1 2.55,-1.8
3D body: height 0.6, standoff 0.45, extent -2.4,-2.1 2.4,-1.8
3D body: height 0.6, standoff 0.15, extent -2.55,-2.1 -2.4,-1.8
3D body: height 0.15, standoff 0, extent -3.15,-2.1 -2.4,-1.8
3D body: height 0.15, standoff 0, extent 2.4,-1.45 3.15,-1.15
3D body: height 0.6, standoff 0.15, extent 2.4,-1.45 2.55,-1.15
3D body: height 0.6, standoff 0.45, extent -2.4,-1.45 2.4,-1.15
3D body: height 0.6, standoff 0.15, extent -2.55,-1.45 -2.4,-1.15
3D body: height 0.15, standoff 0, extent -3.15,-1.45 -2.4,-1.15
3D body: height 0.15, standoff 0, extent 2.4,-0.8 3.15,-0.5
3D body: height 0.6, standoff 0.15, extent 2.4,-0.8 2.55,-0.5
3D body: height 0.6, standoff 0.45, extent -2.4,-0.8 2.4,-0.5
3D body: height 0.6, standoff 0.15, extent -2.55,-0.8 -2.4,-0.5
3D body: height 0.15, standoff 0, extent -3.15,-0.8 -2.4,-0.5
3D body: height 0.15, standoff 0, extent 2.4,-0.15 3.15,0.15
3D body: height 0.6, standoff 0.15, extent 2.4,-0.15 2.55,0.15
3D body: height 0.6, standoff 0.45, extent -2.4,-0.15 2.4,0.15
3D body: height 0.6, standoff 0.15, extent -2.55,-0.15 -2.4,0.15
3D body: height 0.15, standoff 0, extent -3.15,-0.15 -2.4,0.15
3D body: height 0.15, standoff 0, extent 2.4,0.5 3.15,0.8
3D body: height 0.6, standoff 0.15, extent 2.4,0.5 2.55,0.8
3D body: height 0.6, standoff 0.45, extent -2.4,0.5 2.4,0.8
3D body: height 0.6, standoff 0.15, extent -2.55,0.5 -2.4,0.8
3D body: height 0.15, standoff 0, extent -3.15,0.5 -2.4,0.8
3D body: height 0.15, standoff 0, extent 2.4,1.15 3.15,1.45
3D body: height 0.6, standoff 0.15, extent 2.4,1.15 2.55,1.45
3D body: height 0.6, standoff 0.45, extent -2.4,1.15 2.4,1.45
3D body: height 0.6, standoff 0.15, extent -2.55,1.15 -2.4,1.45
3D body: height 0.15, standoff 0, extent -3.15,1.15 -2.4,1.45
3D body: height 1.2, standoff 0.1, extent -2.2,-2.55 2.2,2.55
3D body: height 1.21, standoff 1.2, extent -1.897,1.501 -1.1,2.299
3D body: height 0.15, standoff 0, extent -3.15,1.8 -2.4,2.1
3D body: height 0.6, standoff 0.15, extent -2.55,1.8 -2.4,2.1
3D body: height 0.6, standoff 0.45, extent -2.4,1.8 2.4,2.1
3D body: height 0.6, standoff 0.15, extent 2.4,1.8 2.55,2.1
3D body: height 0.15, standoff 0, extent 2.4,1.8 3.15,2.1

## TSOP65P640X120_HS-16N [mm] "TSOP, 16-Leads, Body 5,1x4,5mm (max), Pitch 0,65mm, IPC Medium Density"
height 1.2
pads (17):
  rrect50% 1.6x0.32 smd mask+0.051: 1(-2.8,2.275)
  oval 1.6x0.32 smd mask+0.051: 2(-2.8,1.625) 3(-2.8,0.975) 4(-2.8,0.325) 5(-2.8,-0.325) 6(-2.8,-0.975) 7(-2.8,-1.625) 8(-2.8,-2.275) 9(2.8,-2.275) 10(2.8,-1.625) 11(2.8,-0.975) 12(2.8,-0.325) 13(2.8,0.325) 14(2.8,0.975) 15(2.8,1.625) 16(2.8,2.275)
  rect 3.4x5 smd paste-5 mask-5: 17(0,0)
via 0.6,0.6 diameter 0.65 hole 0.3
via -0.6,0.6 diameter 0.65 hole 0.3
via -0.6,-0.6 diameter 0.65 hole 0.3
via 0.6,-0.6 diameter 0.65 hole 0.3
via -0.6,-1.8 diameter 0.65 hole 0.3
via 0.6,-1.8 diameter 0.65 hole 0.3
via 0.6,1.8 diameter 0.65 hole 0.3
via -0.6,1.8 diameter 0.65 hole 0.3
Top Overlay:
  circle w0.25: c-2.8,2.985 r0.125
  lines w0.15: -1.6,-2.55 1.6,-2.55 ; -1.6,2.55 1.6,2.55
Top Paste:
  region: -0.925,-1.95 -0.75,-2.125 -0.75,-2.45 -1.65,-2.45 -1.65,-1.95
  region: 0.925,-1.95 0.75,-2.125 0.75,-2.45 1.65,-2.45 1.65,-1.95
  region: 0.925,1.95 0.75,2.125 0.75,2.45 1.65,2.45 1.65,1.95
  region: -0.45,-2.125 -0.275,-1.95 0.275,-1.95 0.45,-2.125 0.45,-2.45 -0.45,-2.45
  region: -0.45,2.125 -0.275,1.95 0.275,1.95 0.45,2.125 0.45,2.45 -0.45,2.45
  region: 0.925,1.65 0.75,1.475 0.75,0.925 0.925,0.75 1.65,0.75 1.65,1.65
  region: 0.925,0.45 0.75,0.275 0.75,-0.275 0.925,-0.45 1.65,-0.45 1.65,0.45
  region: 0.925,-0.75 0.75,-0.925 0.75,-1.475 0.925,-1.65 1.65,-1.65 1.65,-0.75
  region: -0.925,-0.75 -0.75,-0.925 -0.75,-1.475 -0.925,-1.65 -1.65,-1.65 -1.65,-0.75
  region: -0.925,0.45 -0.75,0.275 -0.75,-0.275 -0.925,-0.45 -1.65,-0.45 -1.65,0.45
  region: -0.45,-0.925 -0.275,-0.75 0.275,-0.75 0.45,-0.925 0.45,-1.475 0.275,-1.65 -0.275,-1.65 -0.45,-1.475
  region: -0.45,0.275 -0.275,0.45 0.275,0.45 0.45,0.275 0.45,-0.275 0.275,-0.45 -0.275,-0.45 -0.45,-0.275
  region: -0.45,1.475 -0.275,1.65 0.275,1.65 0.45,1.475 0.45,0.925 0.275,0.75 -0.275,0.75 -0.45,0.925
  region: -0.925,1.65 -0.75,1.475 -0.75,0.925 -0.925,0.75 -1.65,0.75 -1.65,1.65
  region: -0.925,1.95 -0.75,2.125 -0.75,2.45 -1.65,2.45 -1.65,1.95
Top Solder:
  drawing of 8 lines, arcs and shapes, not listed
Mechanical 13:
  circle w0.1: c-1.3,1.6 r0.5
  lines w0.1: -2.25,-2.55 -2.25,2.55 2.25,2.55 2.25,-2.55 -2.25,-2.55
Mechanical 15:
  lines w0.1: -0.5,0 0.5,0 ; 0,-0.5 0,0.5 ; -3.95,-2.8 -3.95,2.8 3.95,2.8 3.95,-2.8 -3.95,-2.8
3D body: height 1.2, standoff 0.05, extent -2.25,-2.55 2.25,2.55

## TSOP65P640X120_HS-16N2 [mm] "TSOP, 16-Leads, Body 5,1x4,5mm (max), Pitch 0,65mm, IPC Medium Density"
height 1.1
pads (17):
  rrect50% 1.6x0.32 smd mask+0.051: 1(-2.8,2.275)
  oval 1.6x0.32 smd mask+0.051: 2(-2.8,1.625) 3(-2.8,0.975) 4(-2.8,0.325) 5(-2.8,-0.325) 6(-2.8,-0.975) 7(-2.8,-1.625) 8(-2.8,-2.275) 9(2.8,-2.275) 10(2.8,-1.625) 11(2.8,-0.975) 12(2.8,-0.325) 13(2.8,0.325) 14(2.8,0.975) 15(2.8,1.625) 16(2.8,2.275)
  rect 3x4 smd paste-5 mask-5: 17(0,0)
via -0.8,1.3 diameter 0.65 hole 0.3
via -0.8,-1.3 diameter 0.65 hole 0.3
via -0.8,0 diameter 0.65 hole 0.3
via 0.8,1.3 diameter 0.65 hole 0.3
via 0.8,0 diameter 0.65 hole 0.3
via 0.8,-1.3 diameter 0.65 hole 0.3
Top Overlay:
  circle w0.25: c-2.8,2.985 r0.125
  lines w0.15: -1.6,-2.55 1.6,-2.55 ; -1.6,2.55 1.6,2.55
Top Paste:
  region: -1.5,1.35 -1.2,1.35 -0.85,1.7 -0.85,2 -1.5,2
  region: 1.5,1.35 1.2,1.35 0.85,1.7 0.85,2 1.5,2
  region: 1.5,-1.35 1.2,-1.35 0.85,-1.7 0.85,-2 1.5,-2
  region: -1.5,-1.35 -1.2,-1.35 -0.85,-1.7 -0.85,-2 -1.5,-2
  region: -0.1,1.35 -0.4,1.35 -0.75,1.7 -0.75,2 -0.1,2
  region: -0.1,1.35 0.4,1.35 0.75,1.7 0.75,2 -0.1,2
  region: -0.1,-1.35 0.4,-1.35 0.75,-1.7 0.75,-2 -0.1,-2
  region: -0.1,-1.35 -0.4,-1.35 -0.75,-1.7 -0.75,-2 -0.1,-2
  region: 1.5,1.25 1.2,1.25 0.85,0.9 0.85,0.6 1.5,0.6
  region: 1.5,0.05 1.2,0.05 0.85,0.4 0.85,0.7 1.5,0.7
  region: -1.5,0.05 -1.2,0.05 -0.85,0.4 -0.85,0.7 -1.5,0.7
  region: -1.5,1.25 -1.2,1.25 -0.85,0.9 -0.85,0.6 -1.5,0.6
  region: -1.5,-1.25 -1.2,-1.25 -0.85,-0.9 -0.85,-0.6 -1.5,-0.6
  region: -1.5,-0.05 -1.2,-0.05 -0.85,-0.4 -0.85,-0.7 -1.5,-0.7
  region: 1.5,-1.25 1.2,-1.25 0.85,-0.9 0.85,-0.6 1.5,-0.6
  region: 1.5,-0.05 1.2,-0.05 0.85,-0.4 0.85,-0.7 1.5,-0.7
  region: -0.1,1.25 -0.4,1.25 -0.75,0.9 -0.75,0.6 -0.1,0.6
  region: -0.1,0.05 -0.4,0.05 -0.75,0.4 -0.75,0.7 -0.1,0.7
  region: -0.1,0.05 0.4,0.05 0.75,0.4 0.75,0.7 -0.1,0.7
  region: -0.1,1.25 0.4,1.25 0.75,0.9 0.75,0.6 -0.1,0.6
  region: -0.1,-0.05 0.4,-0.05 0.75,-0.4 0.75,-0.7 -0.1,-0.7
  region: -0.1,-1.25 0.4,-1.25 0.75,-0.9 0.75,-0.6 -0.1,-0.6
  region: -0.1,-1.25 -0.4,-1.25 -0.75,-0.9 -0.75,-0.6 -0.1,-0.6
  region: -0.1,-0.05 -0.4,-0.05 -0.75,-0.4 -0.75,-0.7 -0.1,-0.7
Top Solder:
  drawing of 12 lines, arcs and shapes, not listed
Mechanical 13:
  circle w0.1: c-1.3,1.6 r0.5
  lines w0.1: -2.25,-2.55 -2.25,2.55 2.25,2.55 2.25,-2.55 -2.25,-2.55
Mechanical 15:
  lines w0.1: -0.5,0 0.5,0 ; 0,-0.5 0,0.5 ; -3.95,-2.8 -3.95,2.8 3.95,2.8 3.95,-2.8 -3.95,-2.8
3D body: height 1.1, standoff 0.05, extent -2.25,-2.55 2.25,2.55
3D body: height 1.11, standoff 1.1, extent -1.8,1.1 -0.8,2.1